# Altium footprint library heromap.PcbLib: 593 footprints (part 34 of 38)
Each footprint in its own frame and in the unit in brackets; x right, y up, seen from the top. Pads: shape width x height; smd on the part's side, far side on the other; paste and mask are expansions set on the pad; w line width, h text height; cw(c..) or ccw(c..) is an arc to the next point about the centre after c.
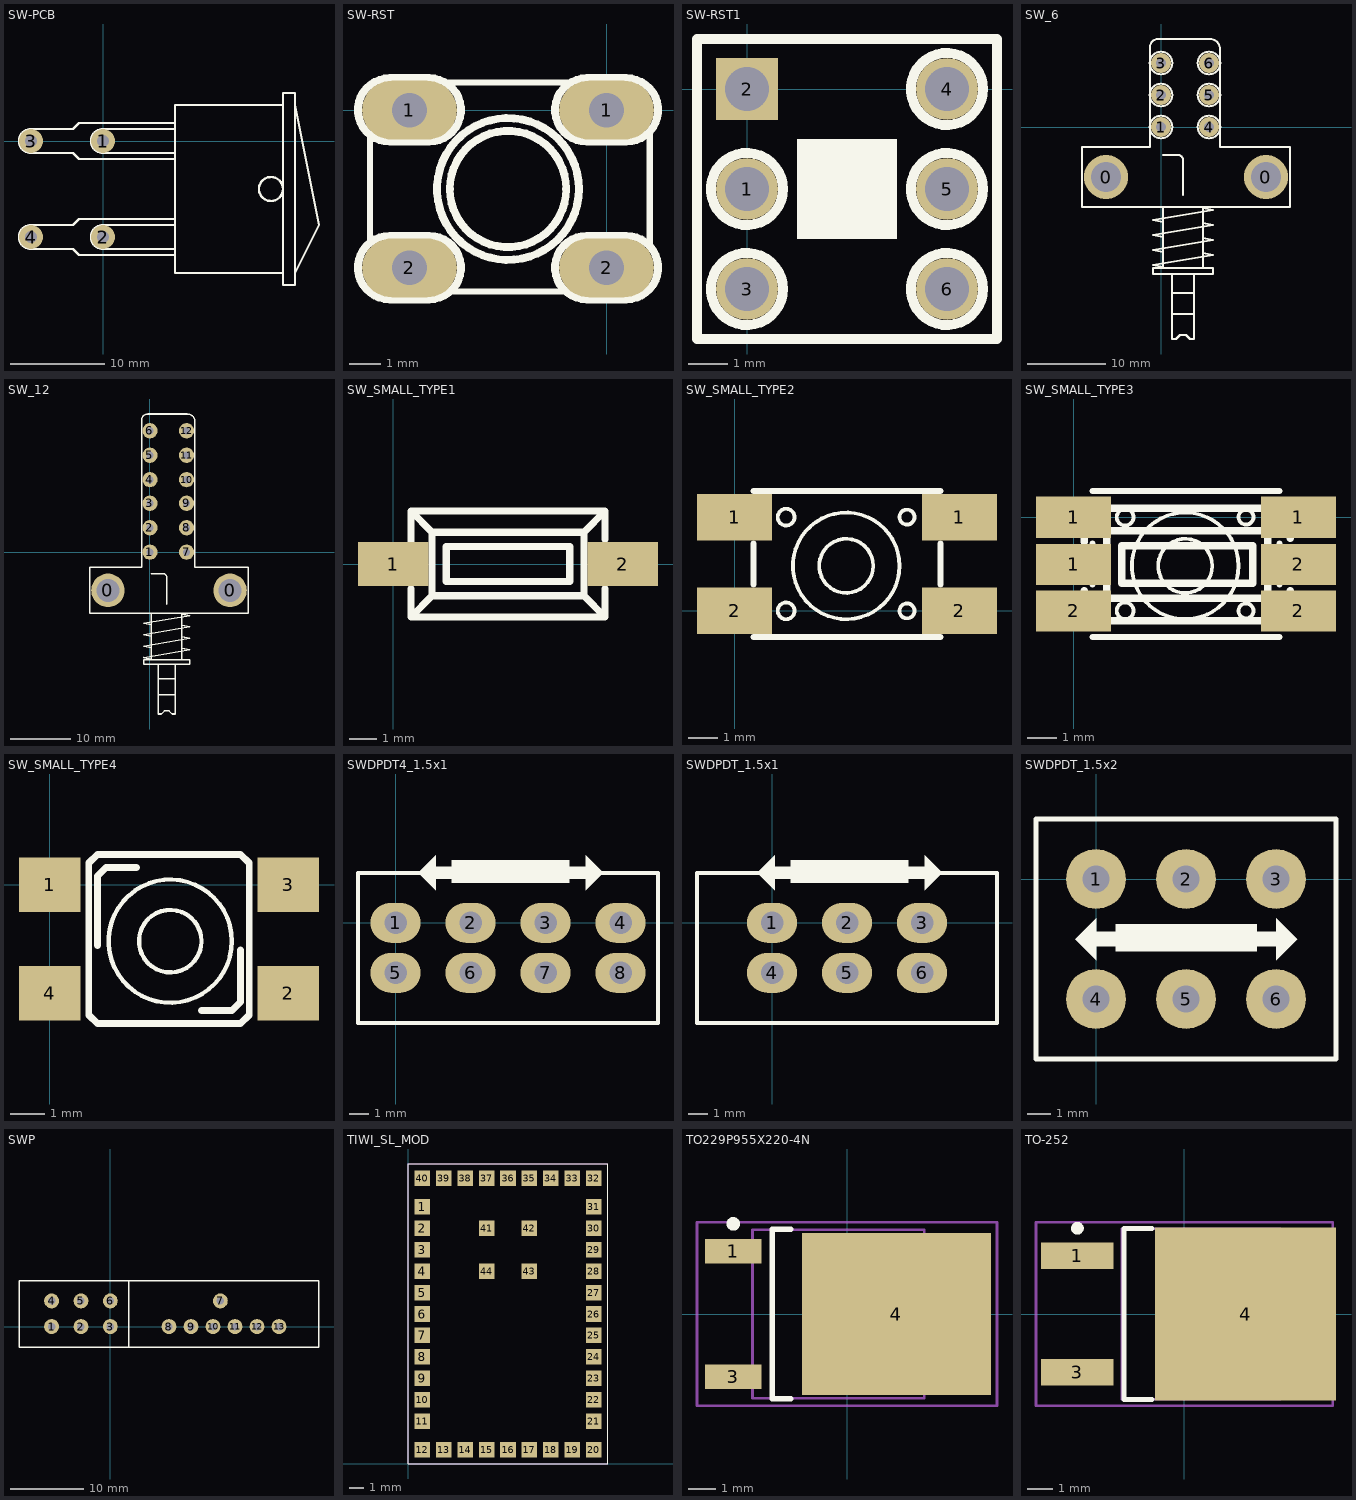
[diagram p33: the footprints below, top view; thin cyan lines are the x and y axes]

## SW-PCB [mm]
pads (4):
  round 2.54 hole 1.27: 1(0,0) 2(0,-10.16) 3(-7.62,0) 4(-7.62,-10.16)
Top Overlay:
  circle w0.254: c17.78,-5.08 r1.27
  lines w0.254: 7.62,-12.065 -2.54,-12.065 -3.175,-11.43 -7.62,-11.43 cw(c-7.62,-10.16) -7.62,-8.89 -3.175,-8.89 -2.54,-8.255 7.62,-8.255 ; 7.62,-11.43 0,-11.43 cw(c0,-10.16) 0,-8.89 7.62,-8.89 ; 7.62,-1.905 -2.54,-1.905 -3.175,-1.27 -7.62,-1.27 cw(c-7.62,0) -7.62,1.27 -3.175,1.27 -2.54,1.905 7.62,1.905 ; 7.62,-1.27 0,-1.27 cw(c0,0) 0,1.27 7.62,1.27 ; 19.05,-13.97 7.62,-13.97 7.62,3.81 19.05,3.81 ; 20.32,-13.97 22.86,-8.89 20.32,3.81 ; 19.05,-15.24 19.05,5.08 20.32,5.08 20.32,-15.24 19.05,-15.24

## SW-RST [mil]
pads (4):
  oval 120x75 hole 44: 1(-250,0) 1(0,0) 2(-250,-200) 2(0,-200)
Top Overlay:
  circle w10: c-125,-100 r90
  circle w10: c-35,-180 r11.18
  circle w10: c-40,-20 r10
  circle w10: c-210,-20 r11.18
  circle w10: c-210,-180 r11.18
  circle w10: c-125,-100 r73.82
  lines w8: -300,-165 -300,-35 ; -200,35 -45,35 ; -195,-230 -50,-230 ; 55,-170 55,-30
  lines w10: -275,-240 cw(c-275,-199.69) -275,-159.38 -225,-159.38 cw(c-225,-199.69) -225,-240 -275,-240 ; -275,-40 cw(c-275,0.31) -275,40.62 -225,40.62 cw(c-225,0.31) -225,-40 -275,-40 ; -25,-240 cw(c-25,-199.69) -25,-159.38 25,-159.38 cw(c25,-199.69) 25,-240 -25,-240 ; -25,-40 cw(c-25,0.31) -25,40.62 25,40.62 cw(c25,0.31) 25,-40 -25,-40
3D body "SW3dPS-.STEP": height 275.59, standoff -137.8, extent -277.51,-220.04 33.52,24.05

## SW-RST1 [mil]
pads (6):
  round 62 hole 44: 1(0,-100) 3(0,-200) 4(200,0) 5(200,-100) 6(200,-200)
  rect 62x62 hole 44: 2(0,0)
Top Overlay:
  circle w10: c200,0 r36.06
  circle w10: c200,-100 r36.06
  circle w10: c200,-200 r36.06
  circle w10: c0,-200 r36.06
  circle w10: c0,-100 r36.06
  rectangle: 50,-150 150,-50
  lines w10: -50,-250 -50,50 250,50 250,-250 -50,-250

## SW_6 [mil]
pads (8):
  round 220 hole 150: 0(-275,-250) 0(525,-250)
  round 100 hole 48: 1(0,0) 2(0,160) 3(0,320) 4(240,0) 5(240,160) 6(240,320)
Top Overlay:
  circle w10: c240,320 r56.57
  circle w10: c240,160 r56.57
  circle w10: c240,0 r56.57
  circle w10: c0,0 r56.57
  circle w10: c0,160 r56.57
  circle w10: c0,320 r56.57
  lines w10: -395,-400 -395,-100 -55,-100 -55,400 cw(c-15,400) -15,440 245,440 cw(c245,390) 295,390 295,-100 645,-100 645,-400 -390,-400 cw(c-390,-395) -395,-395 ; 10,-705 10,-405 ; 10,-700 -40,-690 260,-640 210,-630 ; 10,-625 -40,-615 260,-565 210,-555 ; 10,-550 -40,-540 260,-490 210,-480 ; 10,-475 -40,-465 260,-415 210,-405 210,-705 ; 10,-140 85,-140 cw(c85,-165) 110,-165 110,-340 ; 55,-935 165,-935 ; 55,-830 165,-830 ; 55,-735 55,-1060 75,-1060 95,-1040 125,-1040 145,-1060 165,-1060 165,-735 ; -40,-735 260,-735 260,-705 -40,-705 -40,-735

## SW_12 [mil]
pads (14):
  round 220 hole 150: 0(-275,-250) 0(525,-250)
  round 100 hole 48: 1(0,0) 2(0,160) 3(0,320) 4(0,475) 5(0,635) 6(0,795) 7(240,0) 8(240,160) 9(240,320) 10(240,475) 11(240,635) 12(240,795)
Top Overlay:
  lines w10: -395,-400 -395,-100 -55,-100 -55,400 -55,865 cw(c-15,865) -15,905 245,905 cw(c245,855) 295,855 ; -395,-395 ccw(c-390,-395) -390,-400 645,-400 645,-100 295,-100 295,390 295,860 ; 10,-705 10,-405 ; 10,-700 -40,-690 260,-640 210,-630 ; 10,-625 -40,-615 260,-565 210,-555 ; 10,-550 -40,-540 260,-490 210,-480 ; 10,-475 -40,-465 260,-415 210,-405 210,-705 ; 10,-140 85,-140 cw(c85,-165) 110,-165 110,-340 ; 55,-935 165,-935 ; 55,-830 165,-830 ; 55,-735 55,-1060 75,-1060 95,-1040 125,-1040 145,-1060 165,-1060 165,-735 ; -40,-735 -40,-705 260,-705 260,-735 -40,-735

## SW_SMALL_TYPE1 [mil]
pads (2):
  rect 100x62 smd: 1(0,0) 2(325,0)
Top Overlay:
  lines w10: 25,-35 25,-75 ; 25,30 25,75 ; 300,-35 300,-75 ; 300,35 300,75 ; 25,-75 55,-45 ; 25,-75 300,-75 ; 25,75 55,45 ; 25,75 300,75 ; 55,-45 270,-45 ; 55,-45 55,45 ; 55,45 270,45 ; 270,-45 270,45 ; 270,-45 300,-75 ; 270,45 300,75 ; 75,-25 75,25 250,25 250,-25 75,-25

## SW_SMALL_TYPE2 [mil]
pads (4):
  rect 100x62 on Top hole 2: 1(0,125) 1(300,125) 2(0,0) 2(300,0)
Top Overlay:
  circle w5: c68.82,0 r11.18
  circle w5: c230,0 r10
  circle w5: c230,125 r10
  circle w5: c68.82,125 r11.18
  circle w5: c148.94,60 r71.06
  circle w5: c148.94,60 r36.06
  lines w8: 25,-35 275,-35 ; 25,35 25,90 ; 25,160 275,160 ; 275,35 275,90

## SW_SMALL_TYPE3 [mil]
pads (6):
  rect 100x55 smd: 1(0,-63) 2(300,-63)
  rect 100x55 on Top hole 2: 1(0,0) 1(300,0) 2(0,-125) 2(300,-125)
Top Overlay:
  circle w5: c68.82,-125 r11.18
  circle w5: c230,-125 r10
  circle w5: c230,0 r10
  circle w5: c68.82,0 r11.18
  circle w5: c148.94,-65 r71.06
  circle w5: c148.94,-65 r36.06
  lines w8: 25,-160 275,-160 ; 25,-90 25,-35 ; 25,35 275,35 ; 275,-90 275,-35
  lines w10: 14,-98 14,-138 ; 14,-33 14,12 ; 289,-98 289,-138 ; 289,-28 289,12 ; 14,-138 289,-138 ; 14,-138 44,-108 ; 14,12 289,12 ; 14,12 44,-18 ; 44,-108 44,-18 ; 44,-108 259,-108 ; 44,-18 259,-18 ; 259,-108 289,-138 ; 259,-108 259,-18 ; 259,-18 289,12 ; 64,-88 239,-88 239,-38 64,-38 64,-88

## SW_SMALL_TYPE4 [mm]
pads (4):
  rect 1.8x1.6 smd: 1(0,0) 2(6.985,-3.175) 3(6.985,0) 4(0,-3.175)
Top Overlay:
  circle w0.127: c3.529,-1.651 r1.805
  circle w0.127: c3.529,-1.651 r0.916
  lines w0.203: 1.397,-1.778 1.397,-0.127 1.397,0.254 1.651,0.508 2.54,0.508 ; 4.445,-3.683 5.334,-3.683 5.588,-3.429 5.588,-3.175 5.588,-1.905 ; 5.842,0.127 5.842,0.635 5.588,0.889 1.778,0.889 1.397,0.889 1.143,0.635 1.143,0 1.143,-3.81 1.397,-4.064 5.588,-4.064 5.842,-3.81 5.842,0.508

## SWDPDT4_1.5x1 [mil] "Switch 3 DPDT, Pin to Pin 150mil, Row to Row 100mil"
pads (8):
  oval 100x80 hole 45: 1(0,0) 2(150,0) 3(300,0) 4(450,0) 5(0,-100) 6(150,-100) 7(300,-100) 8(450,-100)
Top Overlay:
  region: 80,135 80,65 45,100
  region: 380,135 380,65 415,100
  region: 112.5,125 347.5,125 347.5,80 112.5,80
  lines w8: -75,-200 525,-200 525,100 -75,100 -75,-200
  lines w25: 75,100 125,100 ; 335,100 385,100

## SWDPDT_1.5x1 [mil] "Switch DPDT, Pin to Pin 150mil, Row to Row 100mil"
pads (6):
  oval 100x80 hole 45: 1(0,0) 2(150,0) 3(300,0) 4(0,-100) 5(150,-100) 6(300,-100)
Top Overlay:
  region: 5,135 5,65 -30,100
  region: 305,135 305,65 340,100
  region: 37.5,125 272.5,125 272.5,80 37.5,80
  lines w8: -150,-200 450,-200 450,100 -150,100 -150,-200
  lines w25: 0,100 50,100 ; 260,100 310,100

## SWDPDT_1.5x2 [mil] "Switch DPDT, Pin to Pin 150mil, Row to Row 200mil"
pads (6):
  round 100 hole 45: 1(0,0) 2(150,0) 3(300,0) 4(0,-200) 5(150,-200) 6(300,-200)
Top Overlay:
  region: 0,-65 0,-135 -35,-100
  region: 300,-65 300,-135 335,-100
  region: 32.5,-75 267.5,-75 267.5,-120 32.5,-120
  lines w8: -100,-300 400,-300 400,100 -100,100 -100,-300
  lines w25: -5,-100 45,-100 ; 255,-100 305,-100

## SWP [mil] "SW Power"
height 100
pads (13):
  round 80 hole 40: 1(-314.96,0) 2(-157.48,0) 3(0,0) 4(-314.96,137.8) 5(-157.48,137.8) 6(0,137.8) 7(590.55,137.8) 8(314.96,0) 9(433.07,0) 10(551.18,0) 11(669.29,0) 12(787.4,0) 13(905.51,0)
Top Overlay:
  lines w8: 100,-109.33 100,245 ; -490,-110 -490,245 1120,245 1120,-110 -490,-110

## TIWI_SL_MOD [mm]
height 2.4
pads (44):
  rect 1.092x1.092 smd: 1(1,18) 2(1,16.5) 3(1,15) 4(1,13.5) 5(1,12) 6(1,10.5) 7(1,9) 8(1,7.5) 9(1,6) 10(1,4.5) 11(1,3) 12(1,1) 13(2.5,1) 14(4,1) 15(5.5,1) 16(7,1) 17(8.5,1) 18(10,1) 19(11.5,1) 20(13,1) 21(13,3) 22(13,4.5) 23(13,6) 24(13,7.5) 25(13,9) 26(13,10.5) 27(13,12) 28(13,13.5) 29(13,15) 30(13,16.5) 31(13,18) 32(13,20) 33(11.5,20) 34(10,20) 35(8.5,20) 36(7,20) 37(5.5,20) 38(4,20) 39(2.5,20) 40(1,20) 41(5.5,16.5) 42(8.5,16.5) 43(8.5,13.5) 44(5.5,13.5)
Top Overlay:
  lines w0.064: 0,0 14,0 14,21 0,21 0,0
Mechanical 1:
  lines w0.064: 0,0 14,0 ; 0,0 0,21 ; 0,0 14,0 ; 0,0 0,21 ; 0,21 14,21 ; 0,21 14,21 ; 14,0 14,21 ; 14,0 14,21
3D body: height 1, standoff 0, extent 0,0 14,21
3D body: height 2.3, standoff 0.1, extent 1,1 13,20

## TO229P955X220-4N [mm] "KTP D-PAK, 4-Pads, Body 6,3x6,2mm (max), IPC Medium Density"
height 2.2
pads (4):
  rect 2.05x0.9 smd: 1(-4.15,2.29) 3(-4.15,-2.29)
  rect 0x0 smd: 2(-4.15,0)
  rect 6.9x5.9 smd: 4(1.8,0)
Top Overlay:
  circle w0.25: c-4.15,3.29 r0.125
  lines w0.2: -2.05,-3.1 -2.725,-3.1 -2.725,3.1 -2.05,3.1
Mechanical 13:
  lines w0.1: -3.45,-3.075 -3.45,3.075 2.82,3.075 2.82,-3.075 -3.45,-3.075
Mechanical 15:
  lines w0.1: -0.5,0 0.5,0 ; 0,-0.5 0,0.5 ; -5.475,-3.35 -5.475,3.35 5.475,3.35 5.475,-3.35 -5.475,-3.35
3D body: height 2.2, standoff 0.1, extent -3.45,-3.075 2.82,3.075
3D body: height 0.35, standoff 0.1, extent -4.928,1.88 -4.14,2.718
3D body: height 1, standoff 0.75, extent -4.318,1.88 -3.454,2.718
3D body: height 1, standoff 0.1, extent -4.318,1.88 -4.14,2.718
3D body: height 1, standoff 0.1, extent -4.314,-2.718 -4.136,-1.88
3D body: height 1, standoff 0.75, extent -4.314,-2.718 -3.45,-1.88
3D body: height 0.35, standoff 0.1, extent -4.923,-2.718 -4.136,-1.88
3D body: height 0.5, standoff 0, extent 2.87,-2.819 4.14,2.845
3D body: height 1, standoff 0.75, extent -3.992,-0.381 -3.129,0.457

## TO-252 [mm] "KVU D-PAK, 3-Pads, Body 6,2x6,7mm (max), IPC Medium Density"
height 2.4
pads (3):
  rect 2.85x1.05 smd: 1(-4.2,2.29) 3(-4.2,-2.29)
  rect 7.1x6.8 smd: 4(2.4,0)
Top Overlay:
  circle w0.25: c-4.2,3.365 r0.125
  lines w0.2: -1.27,-3.35 -2.375,-3.35 -2.375,3.35 -1.27,3.35
Mechanical 13:
  lines w0.1: -2.45,-3.35 -2.45,3.35 3.77,3.35 3.77,-3.35 -2.45,-3.35
Mechanical 15:
  lines w0.1: -0.5,0 0.5,0 ; 0,-0.5 0,0.5 ; -5.825,-3.6 -5.825,3.6 5.825,3.6 5.825,-3.6 -5.825,-3.6
3D body: height 2.4, standoff 0.1, extent -2.45,-3.35 3.77,3.35
3D body: height 0.35, standoff 0.1, extent -5.025,1.782 -3.374,2.798
3D body: height 1.35, standoff 1.1, extent -3.683,1.778 -2.375,2.794
3D body: height 1.35, standoff 0, extent -3.683,1.778 -3.374,2.798
3D body: height 1.35, standoff 0, extent -3.683,-2.794 -3.374,-1.774
3D body: height 1.35, standoff 1.1, extent -3.683,-2.794 -2.375,-1.778
3D body: height 0.35, standoff 0.1, extent -5.025,-2.79 -3.374,-1.774
3D body: height 0.75, standoff 0.1, extent 3.77,-2.921 5.08,2.921
3D body: height 1.35, standoff 1.1, extent -3.104,-0.508 -1.796,0.508